# Altium footprint library AI.PcbLib: 137 footprints (part 5 of 9)
Each footprint in its own frame and in the unit in brackets; x right, y up, seen from the top. Pads: shape width x height; smd on the part's side, far side on the other; paste and mask are expansions set on the pad; w line width, h text height; cw(c..) or ccw(c..) is an arc to the next point about the centre after c.
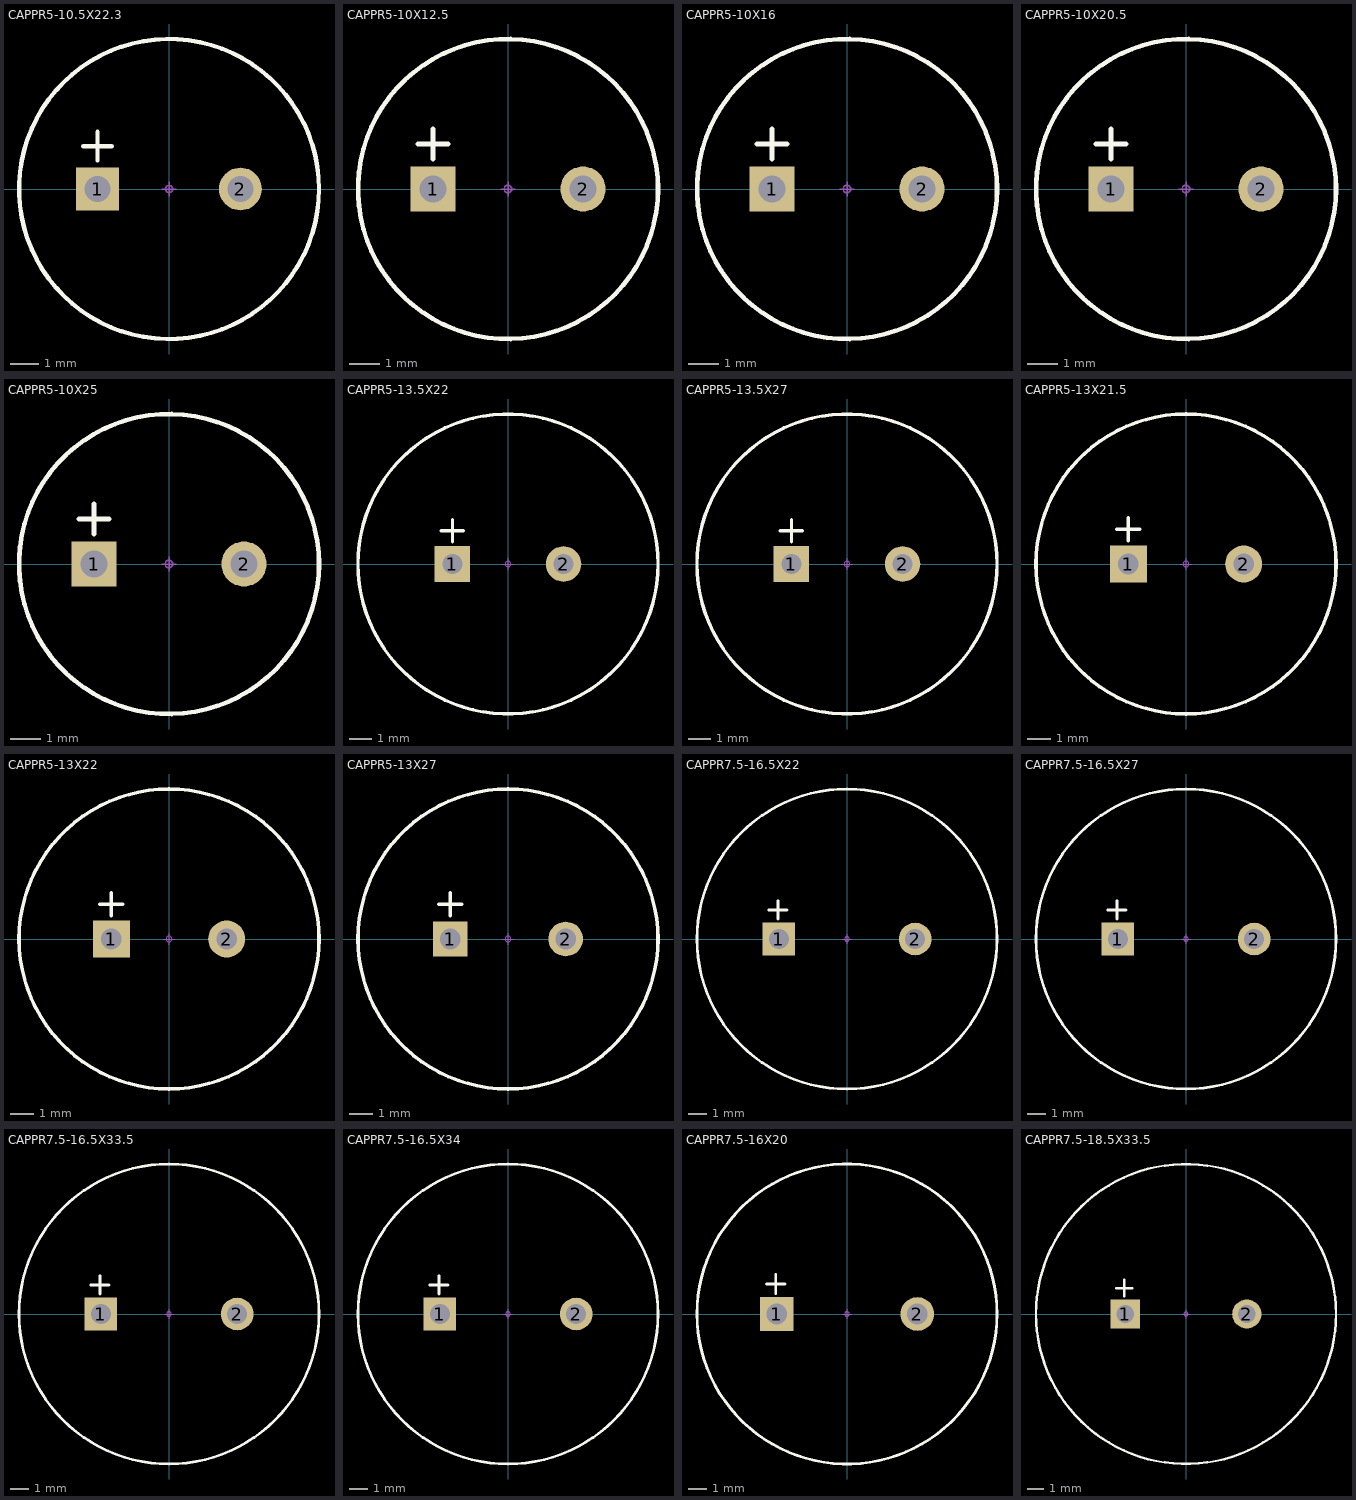
[diagram p4: the footprints below, top view; thin cyan lines are the x and y axes]

## CAPPR5-10.5X22.3 [mm]
pads (2):
  rect 1.5x1.5 hole 0.9: 1(-2.5,0)
  round 1.5 hole 0.9: 2(2.5,0)
Top Overlay:
  circle w0.152: c0,0 r5.25
  lines w0.152: -3,1.5 -2,1.5 ; -2.5,1 -2.5,2
Mechanical 15:
  circle w0.05: c0,0 r0.125
  lines w0.05: -0.25,0 0.25,0 ; 0,-0.25 0,0.25
3D body "CAPPR500-1050X2230.stp": height 22.3, standoff -3.6, extent -5.25,-5.25 5.25,5.25

## CAPPR5-10X12.5 [mm]
pads (2):
  rect 1.5x1.5 hole 0.9: 1(-2.5,0)
  round 1.5 hole 0.9: 2(2.5,0)
Top Overlay:
  circle w0.152: c0,0 r5
  lines w0.152: -3,1.5 -2,1.5 ; -2.5,1 -2.5,2
Mechanical 15:
  circle w0.05: c0,0 r0.125
  lines w0.05: -0.25,0 0.25,0 ; 0,-0.25 0,0.25
3D body "CAPPR500-1000X1250.stp": height 12.5, standoff -3.6, extent -5.01,-5.027 4.99,4.973

## CAPPR5-10X16 [mm]
pads (2):
  rect 1.5x1.5 hole 0.9: 1(-2.5,0)
  round 1.5 hole 0.9: 2(2.5,0)
Top Overlay:
  circle w0.152: c0,0 r5
  lines w0.152: -3,1.5 -2,1.5 ; -2.5,1 -2.5,2
Mechanical 15:
  circle w0.05: c0,0 r0.125
  lines w0.05: -0.25,0 0.25,0 ; 0,-0.25 0,0.25
3D body "CAPPR500-1000X1600.stp": height 16, standoff -3.6, extent -5.01,-5.01 4.99,4.99

## CAPPR5-10X20.5 [mm]
pads (2):
  rect 1.5x1.5 hole 0.9: 1(-2.5,0)
  round 1.5 hole 0.9: 2(2.5,0)
Top Overlay:
  circle w0.152: c0,0 r5
  lines w0.152: -3,1.5 -2,1.5 ; -2.5,1 -2.5,2
Mechanical 15:
  circle w0.05: c0,0 r0.125
  lines w0.05: -0.25,0 0.25,0 ; 0,-0.25 0,0.25
3D body "CAPPR500-1000X2050.stp": height 20.5, standoff -3.6, extent -5,-5 5,5

## CAPPR5-10X25 [mm]
pads (2):
  rect 1.5x1.5 hole 0.9: 1(-2.5,0)
  round 1.5 hole 0.9: 2(2.5,0)
Top Overlay:
  circle w0.152: c0,0 r5
  lines w0.152: -3,1.5 -2,1.5 ; -2.5,1 -2.5,2
Mechanical 15:
  circle w0.05: c0,0 r0.125
  lines w0.05: -0.25,0 0.25,0 ; 0,-0.25 0,0.25
3D body "CAPPR500-1000X2500.stp": height 25, standoff -3.6, extent -5.01,-5.01 4.99,4.99

## CAPPR5-13.5X22 [mm]
pads (2):
  rect 1.6x1.6 hole 0.9: 1(-2.5,0)
  round 1.6 hole 0.9: 2(2.5,0)
Top Overlay:
  circle w0.152: c0,0 r6.75
  lines w0.152: -3,1.5 -2,1.5 ; -2.5,1 -2.5,2
Mechanical 15:
  circle w0.05: c0,0 r0.125
  lines w0.05: -0.25,0 0.25,0 ; 0,-0.25 0,0.25
3D body "CAPPR500-1350X2200.stp": height 22.5, standoff -3.6, extent -6.75,-6.75 6.75,6.75

## CAPPR5-13.5X27 [mm]
pads (2):
  rect 1.6x1.6 hole 0.9: 1(-2.5,0)
  round 1.6 hole 0.9: 2(2.5,0)
Top Overlay:
  circle w0.152: c0,0 r6.75
  lines w0.152: -3,1.5 -2,1.5 ; -2.5,1 -2.5,2
Mechanical 15:
  circle w0.05: c0,0 r0.125
  lines w0.05: -0.25,0 0.25,0 ; 0,-0.25 0,0.25
3D body "CAPPR500-1350X2700.stp": height 27, standoff -3.6, extent -6.75,-6.75 6.75,6.75

## CAPPR5-13X21.5 [mm]
pads (2):
  rect 1.6x1.6 hole 0.9: 1(-2.5,0)
  round 1.6 hole 0.9: 2(2.5,0)
Top Overlay:
  circle w0.152: c0,0 r6.5
  lines w0.152: -3,1.5 -2,1.5 ; -2.5,1 -2.5,2
Mechanical 15:
  circle w0.05: c0,0 r0.125
  lines w0.05: -0.25,0 0.25,0 ; 0,-0.25 0,0.25
3D body "CAPPR500-1300X2150.stp": height 21.5, standoff -3.6, extent -6.5,-6.5 6.5,6.5

## CAPPR5-13X22 [mm]
pads (2):
  rect 1.6x1.6 hole 0.9: 1(-2.5,0)
  round 1.6 hole 0.9: 2(2.5,0)
Top Overlay:
  circle w0.152: c0,0 r6.5
  lines w0.152: -3,1.5 -2,1.5 ; -2.5,1 -2.5,2
Mechanical 15:
  circle w0.05: c0,0 r0.125
  lines w0.05: -0.25,0 0.25,0 ; 0,-0.25 0,0.25
3D body "CAPPR500-1300X2200.stp": height 22, standoff -3.6, extent -6.5,-6.5 6.5,6.5

## CAPPR5-13X27 [mm]
pads (2):
  rect 1.5x1.5 hole 0.9: 1(-2.5,0)
  round 1.5 hole 0.9: 2(2.5,0)
Top Overlay:
  circle w0.152: c0,0 r6.5
  lines w0.152: -3,1.5 -2,1.5 ; -2.5,1 -2.5,2
Mechanical 15:
  circle w0.05: c0,0 r0.125
  lines w0.05: -0.25,0 0.25,0 ; 0,-0.25 0,0.25
3D body "CAPPR500-1300X2700.stp": height 27, standoff -3.6, extent -6.5,-6.5 6.5,6.5

## CAPPR7.5-16.5X22 [mm]
pads (2):
  rect 1.8x1.8 hole 1.1: 1(-3.75,0)
  round 1.8 hole 1.1: 2(3.75,0)
Top Overlay:
  circle w0.152: c0,0 r8.25
  lines w0.152: -4.3,1.6 -3.3,1.6 ; -3.8,1.1 -3.8,2.1
Mechanical 15:
  circle w0.05: c0,0 r0.125
  lines w0.05: -0.25,0 0.25,0 ; 0,-0.25 0,0.25
3D body "CAPPR750-1650X2200.stp": height 22, standoff -3.6, extent -8.25,-8.25 8.25,8.25

## CAPPR7.5-16.5X27 [mm]
pads (2):
  rect 1.8x1.8 hole 1.1: 1(-3.75,0)
  round 1.8 hole 1.1: 2(3.75,0)
Top Overlay:
  circle w0.152: c0,0 r8.25
  lines w0.152: -4.3,1.6 -3.3,1.6 ; -3.8,1.1 -3.8,2.1
Mechanical 15:
  circle w0.05: c0,0 r0.125
  lines w0.05: -0.25,0 0.25,0 ; 0,-0.25 0,0.25
3D body "CAPPR750-1650X2700.stp": height 27, standoff -3.6, extent -8.25,-8.25 8.25,8.25

## CAPPR7.5-16.5X33.5 [mm]
pads (2):
  rect 1.8x1.8 hole 1.1: 1(-3.75,0)
  round 1.8 hole 1.1: 2(3.75,0)
Top Overlay:
  circle w0.152: c0,0 r8.25
  lines w0.152: -4.3,1.6 -3.3,1.6 ; -3.8,1.1 -3.8,2.1
Mechanical 15:
  circle w0.05: c0,0 r0.125
  lines w0.05: -0.25,0 0.25,0 ; 0,-0.25 0,0.25
3D body "CAPPR750-1650X3350.stp": height 33.5, standoff -3.6, extent -8.25,-8.25 8.25,8.25

## CAPPR7.5-16.5X34 [mm]
pads (2):
  rect 1.8x1.8 hole 1.1: 1(-3.75,0)
  round 1.8 hole 1.1: 2(3.75,0)
Top Overlay:
  circle w0.152: c0,0 r8.25
  lines w0.152: -4.3,1.6 -3.3,1.6 ; -3.8,1.1 -3.8,2.1
Mechanical 15:
  circle w0.05: c0,0 r0.125
  lines w0.05: -0.25,0 0.25,0 ; 0,-0.25 0,0.25
3D body "CAPPR750-1650X3400.stp": height 34, standoff -3.6, extent -8.25,-8.25 8.25,8.25

## CAPPR7.5-16X20 [mm]
pads (2):
  rect 1.8x1.8 hole 1.1: 1(-3.75,0)
  round 1.8 hole 1.1: 2(3.75,0)
Top Overlay:
  circle w0.152: c0,0 r8
  lines w0.152: -4.3,1.6 -3.3,1.6 ; -3.8,1.1 -3.8,2.1
Mechanical 15:
  circle w0.05: c0,0 r0.125
  lines w0.05: -0.25,0 0.25,0 ; 0,-0.25 0,0.25
3D body "CAPPR750-1600X2000.stp": height 20, standoff -3.6, extent -8,-8 8,8

## CAPPR7.5-18.5X33.5 [mm]
pads (2):
  rect 1.8x1.8 hole 1.1: 1(-3.75,0)
  round 1.8 hole 1.1: 2(3.75,0)
Top Overlay:
  circle w0.152: c0,0 r9.25
  lines w0.152: -4.3,1.6 -3.3,1.6 ; -3.8,1.1 -3.8,2.1
Mechanical 15:
  circle w0.05: c0,0 r0.125
  lines w0.05: -0.25,0 0.25,0 ; 0,-0.25 0,0.25
3D body "CAPPR750-1850X3350.stp": height 33.5, standoff -3.6, extent -9.25,-9.25 9.25,9.25